# Altium footprint library WR-TBL_Rising Cage Clamp.PcbLib: 435 footprints (part 4 of 28)
Each footprint in its own frame and in the unit in brackets; x right, y up, seen from the top. Pads: shape width x height; smd on the part's side, far side on the other; paste and mask are expansions set on the pad; w line width, h text height; cw(c..) or ccw(c..) is an arc to the next point about the centre after c.
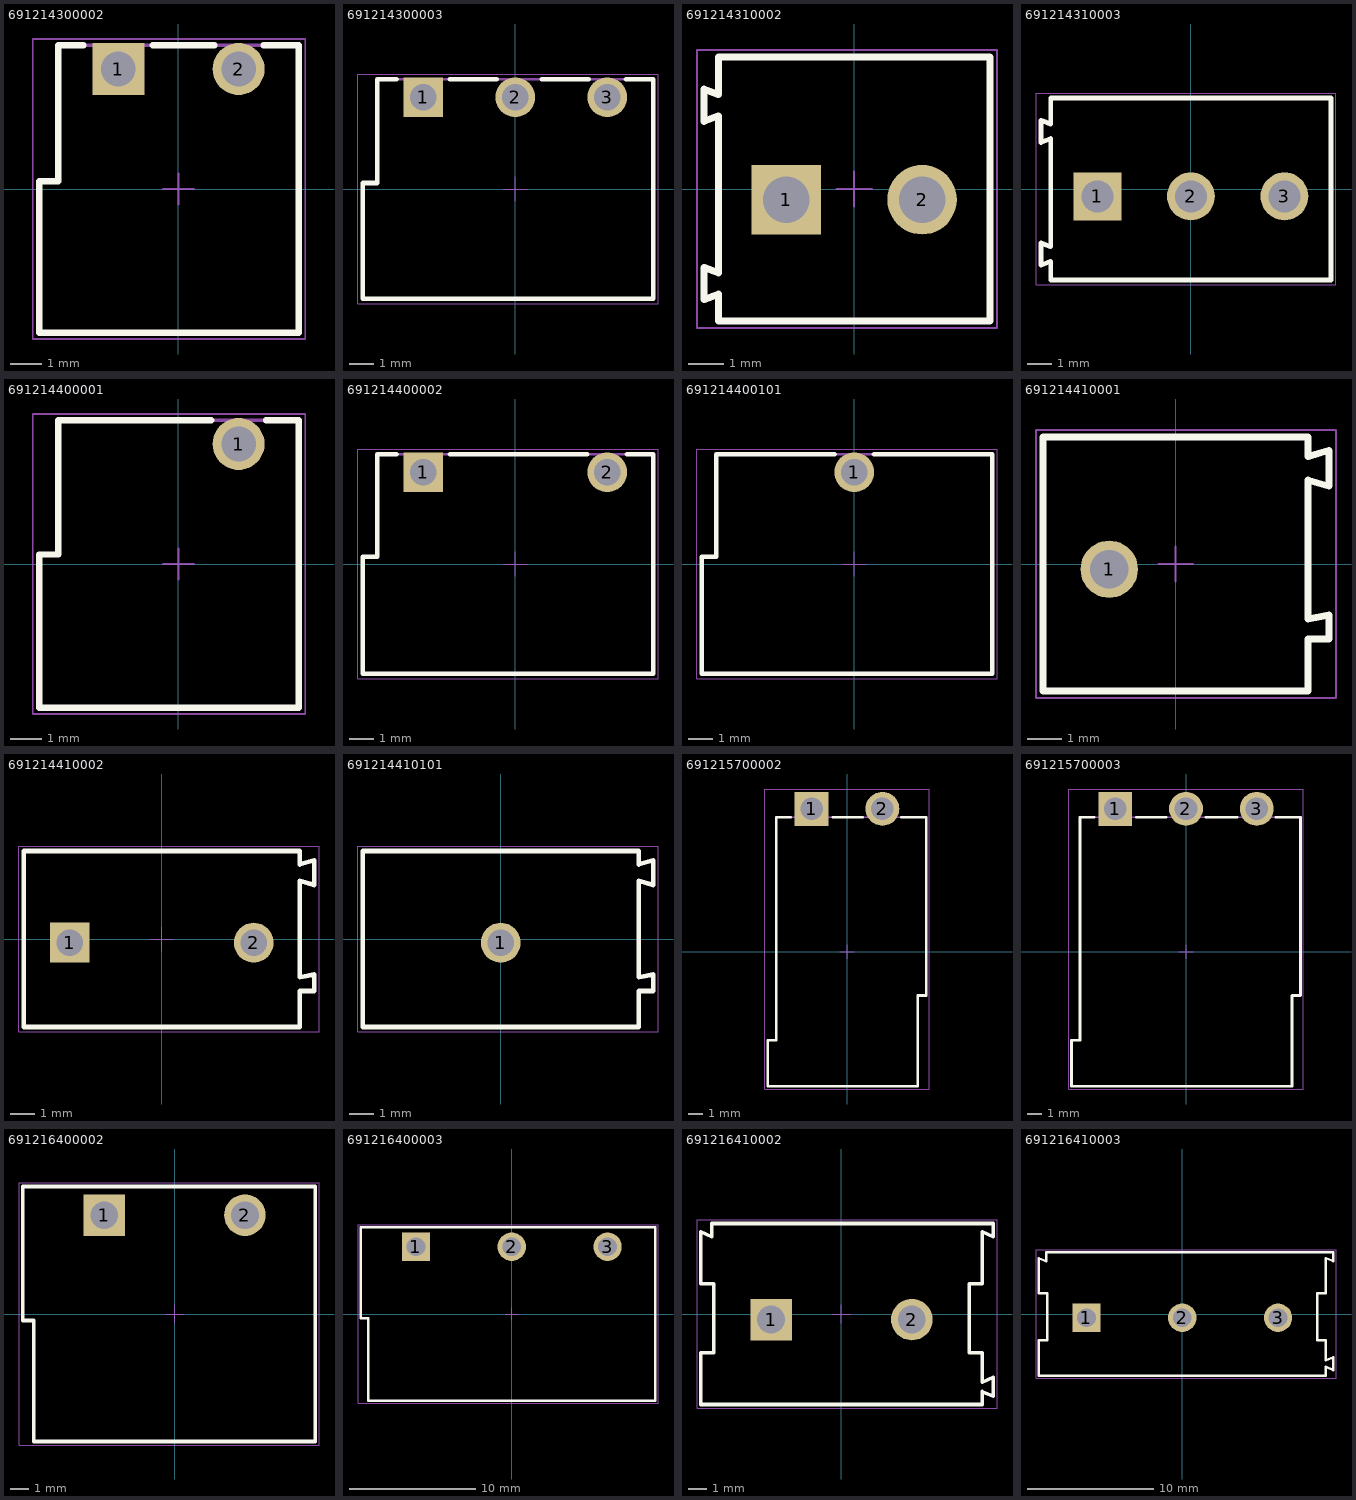
[diagram p3: the footprints below, top view; thin cyan lines are the x and y axes]

## 691214300002 [mm] "Serie 2143 - 3.81 mm _ 2 pins"
height 7.3
pads (2):
  rect 1.65x1.65 hole 1.1: 1(-1.905,3.8)
  round 1.65 hole 1.1: 2(1.905,3.8)
Top Overlay:
  lines w0.2: -3.01,4.55 -3.81,4.55 -3.81,0.25 -4.41,0.25 -4.41,-4.55 3.81,-4.55 3.81,4.55 2.69,4.55 ; -0.81,4.55 1.14,4.55
Mechanical 13:
  lines w0.1: -4.41,-4.55 3.81,-4.55 3.81,4.55 -3.81,4.55 -3.81,0.25 -4.41,0.25 -4.41,-4.55
Mechanical 15:
  lines w0.05: -0.5,0 0.5,0 ; 0,-0.5 0,0.5 ; -4.61,-4.75 4.01,-4.75 4.01,4.75 -4.61,4.75 -4.61,-4.75
3D body "691214300002.stp": height 7.35, standoff -3.45, extent -4.41,-4.55 3.81,4.55

## 691214300003 [mm] "Serie 2143 - 3.81 mm _ 3 pins"
height 7.3
pads (3):
  rect 1.65x1.65 hole 1.1: 1(-3.81,3.8)
  round 1.65 hole 1.1: 2(0,3.8) 3(3.81,3.8)
Top Overlay:
  lines w0.2: -4.915,4.55 -5.715,4.55 -5.715,0.25 -6.315,0.25 -6.315,-4.55 5.715,-4.55 5.715,4.55 4.595,4.55 ; -2.715,4.55 -0.765,4.55 ; 1.095,4.55 3.045,4.55
Mechanical 13:
  lines w0.1: -6.315,-4.55 5.715,-4.55 5.715,4.55 -5.715,4.55 -5.715,0.25 -6.315,0.25 -6.315,-4.55
Mechanical 15:
  lines w0.05: -0.5,0 0.5,0 ; 0,-0.5 0,0.5 ; -6.515,-4.75 5.915,-4.75 5.915,4.75 -6.515,4.75 -6.515,-4.75
3D body "691214300003.stp": height 7.35, standoff -3.45, extent -6.315,-4.55 5.715,4.55

## 691214310002 [mm] "3,81mm - Horizontal wire entry - Rising cage clamp - 02p"
height 8.5
pads (2):
  rect 1.95x1.95 hole 1.3: 1(-1.905,-0.3)
  round 1.95 hole 1.3: 2(1.905,-0.3)
Top Overlay:
  lines w0.2: -4.205,-3.1 -3.805,-2.95 -3.805,-3.7 3.805,-3.7 3.805,3.7 -3.805,3.7 -3.805,2.65 -4.205,2.8 -4.205,1.9 -3.805,2.05 -3.805,-2.35 -4.205,-2.2 -4.205,-3.1
Mechanical 13:
  lines w0.1: -4.205,-3.1 -4.205,-2.2 -3.805,-2.35 -3.805,2.05 -4.205,1.9 -4.205,2.8 -3.805,2.65 -3.805,3.7 3.805,3.7 3.805,-3.7 -3.805,-3.7 -3.805,-2.95 -4.205,-3.1
Mechanical 15:
  lines w0.05: -0.5,0 0.5,0 ; 0,-0.5 0,0.5 ; -4.405,-3.9 -4.405,3.9 4.005,3.9 4.005,-3.9 -4.405,-3.9
3D body "691214310002.stp": height 8.55, standoff -3.75, extent -4.215,-3.7 3.805,3.7

## 691214310003 [mm] "3,81mm - Horizontal wire entry - Rising cage clamp - 03p"
height 8.5
pads (3):
  rect 1.95x1.95 hole 1.3: 1(-3.81,-0.3)
  round 1.95 hole 1.3: 2(0,-0.3) 3(3.81,-0.3)
Top Overlay:
  lines w0.2: -6.11,-3.1 -5.71,-2.95 -5.71,-3.7 5.71,-3.7 5.71,3.7 -5.71,3.7 -5.71,2.65 -6.11,2.8 -6.11,1.9 -5.71,2.05 -5.71,-2.35 -6.11,-2.2 -6.11,-3.1
Mechanical 13:
  lines w0.1: -6.11,-3.1 -6.11,-2.2 -5.71,-2.35 -5.71,2.05 -6.11,1.9 -6.11,2.8 -5.71,2.65 -5.71,3.7 5.71,3.7 5.71,-3.7 -5.71,-3.7 -5.71,-2.95 -6.11,-3.1
Mechanical 15:
  lines w0.05: -0.5,0 0.5,0 ; 0,-0.5 0,0.5 ; -6.31,-3.9 -6.31,3.9 5.91,3.9 5.91,-3.9 -6.31,-3.9
3D body "691214310003.stp": height 8.55, standoff -3.75, extent -6.12,-3.7 5.71,3.7

## 691214400001 [mm] "7.62 mm Vertical Cable Entry with Rising Cage Clamp, 1 pin"
height 7.3
pads (1):
  round 1.65 hole 1.1: 1(1.905,3.8)
Top Overlay:
  lines w0.2: 1.04,4.55 -3.81,4.55 -3.81,0.3 -4.41,0.3 -4.41,-4.55 3.81,-4.55 3.81,4.55 2.77,4.55
Mechanical 13:
  lines w0.1: -4.41,-4.55 3.81,-4.55 3.81,4.55 -3.81,4.55 -3.81,0.3 -4.41,0.3 -4.41,-4.55
Mechanical 15:
  lines w0.05: -0.5,0 0.5,0 ; 0,-0.5 0,0.5 ; -4.61,-4.75 4.01,-4.75 4.01,4.75 -4.61,4.75 -4.61,-4.75
3D body "691214400001.stp": height 7.4, standoff -3.4, extent -4.41,-4.55 3.81,4.55

## 691214400002 [mm] "7.62 mm Vertical Cable Entry with Rising Cage Clamp, 2 pins"
height 7.3
pads (2):
  rect 1.65x1.65 hole 1.1: 1(-3.81,3.8)
  round 1.65 hole 1.1: 2(3.81,3.8)
Top Overlay:
  lines w0.2: -4.915,4.55 -5.715,4.55 -5.715,0.3 -6.315,0.3 -6.315,-4.55 5.715,-4.55 5.715,4.55 4.635,4.55 ; -2.705,4.55 2.985,4.55
Mechanical 13:
  lines w0.1: -6.315,-4.55 -6.315,0.3 -5.715,0.3 -5.715,4.55 5.715,4.55 5.715,-4.55 -6.315,-4.55
Mechanical 15:
  lines w0.05: -0.5,0 0.5,0 ; 0,-0.5 0,0.5 ; -6.515,-4.75 -6.515,4.75 5.915,4.75 5.915,-4.75 -6.515,-4.75
3D body "691214400002.stp": height 7.4, standoff -3.4, extent -6.315,-4.55 5.715,4.55

## 691214400101 [mm] "7.62 mm Vertical Cable Entry with Rising Cage Clamp, 1 pin"
height 7.3
pads (1):
  round 1.65 hole 1.1: 1(0,3.8)
Top Overlay:
  lines w0.2: -0.815,4.55 -5.715,4.55 -5.715,0.3 -6.315,0.3 -6.315,-4.55 5.715,-4.55 5.715,4.55 0.815,4.55
Mechanical 13:
  lines w0.1: -6.315,-4.55 5.715,-4.55 5.715,4.55 -5.715,4.55 -5.715,0.3 -6.315,0.3 -6.315,-4.55
Mechanical 15:
  lines w0.05: -0.5,0 0.5,0 ; 0,-0.5 0,0.5 ; -6.515,-4.75 5.915,-4.75 5.915,4.75 -6.515,4.75 -6.515,-4.75
3D body "691214400101.stp": height 7.4, standoff -3.4, extent -6.315,-4.55 5.715,4.55

## 691214410001 [mm] "7.62 mm Horizontal Entry w. Rising Cage Clamp, 01p"
height 9.1
pads (1):
  round 1.65 hole 1.1: 1(-1.905,-0.15)
Top Overlay:
  lines w0.2: -3.81,-3.65 -3.81,3.65 3.81,3.65 3.81,3.09 4.41,3.265 4.41,2.235 3.81,2.41 3.81,-1.58 4.41,-1.47 4.41,-2.15 3.81,-2.15 3.81,-3.65 -3.81,-3.65
Mechanical 13:
  lines w0.1: -3.81,-3.65 3.81,-3.65 3.81,-2.15 4.41,-2.15 4.41,-1.47 3.81,-1.58 3.81,2.41 4.41,2.235 4.41,3.265 3.81,3.09 3.81,3.65 -3.81,3.65 -3.81,-3.65
Mechanical 15:
  lines w0.05: -0.5,0 0.5,0 ; 0,-0.5 0,0.5 ; -4.01,-3.85 -4.01,3.85 4.61,3.85 4.61,-3.85 -4.01,-3.85
3D body "691214410001.stp": height 9.2, standoff -3.4, extent -3.81,-3.65 4.41,3.65

## 691214410002 [mm] "7.62 mm Horizontal Entry w. Rising Cage Clamp, 02p"
height 9.1
pads (2):
  rect 1.65x1.65 hole 1.1: 1(-3.81,-0.15)
  round 1.65 hole 1.1: 2(3.81,-0.15)
Top Overlay:
  lines w0.2: -5.715,-3.65 5.715,-3.65 5.715,-2.15 6.315,-2.15 6.315,-1.47 5.715,-1.58 5.715,2.41 6.315,2.235 6.315,3.265 5.715,3.09 5.715,3.65 -5.715,3.65 -5.715,-3.65
Mechanical 13:
  lines w0.1: -5.715,-3.65 -5.715,3.65 5.715,3.65 5.715,3.09 6.315,3.265 6.315,2.235 5.715,2.41 5.715,-1.58 6.315,-1.47 6.315,-2.15 5.715,-2.15 5.715,-3.65 -5.715,-3.65
Mechanical 15:
  lines w0.05: -0.5,0 0.5,0 ; 0,-0.5 0,0.5 ; -5.915,-3.85 6.515,-3.85 6.515,3.85 -5.915,3.85 -5.915,-3.85
3D body "691214410002.stp": height 9.2, standoff -3.4, extent -5.715,-3.65 6.315,3.65

## 691214410101 [mm] "7.62 mm Horizontal Entry w. Rising Cage Clamp, 01p"
height 9.1
pads (1):
  round 1.65 hole 1.1: 1(0,-0.15)
Top Overlay:
  lines w0.2: -5.715,-3.65 5.715,-3.65 5.715,-2.15 6.315,-2.15 6.315,-1.47 5.715,-1.58 5.715,2.41 6.315,2.235 6.315,3.265 5.715,3.09 5.715,3.65 -5.715,3.65 -5.715,-3.65
Mechanical 13:
  lines w0.1: -5.715,-3.65 -5.715,3.65 5.715,3.65 5.715,3.09 6.315,3.265 6.315,2.235 5.715,2.41 5.715,-1.58 6.315,-1.47 6.315,-2.15 5.715,-2.15 5.715,-3.65 -5.715,-3.65
Mechanical 15:
  lines w0.05: -0.5,0 0.5,0 ; 0,-0.5 0,0.5 ; -5.915,-3.85 6.515,-3.85 6.515,3.85 -5.915,3.85 -5.915,-3.85
3D body "691214410101.stp": height 9.2, standoff -3.4, extent -5.715,-3.65 6.315,3.65

## 691215700002 [mm]
height 10.5
pads (2):
  rect 2.4x2.4 hole 1.6: 1(-2.5,10.1)
  round 2.4 hole 1.6: 2(2.5,10.1)
Top Overlay:
  lines w0.2: -4,9.5 -5,9.5 -5,-6.25 -5.6,-6.25 -5.6,-9.5 5,-9.5 5,-3.1 5.6,-3.1 5.6,9.5 3.85,9.5 ; -1,9.5 1.1,9.5
Mechanical 13:
  lines w0.1: -5.6,-9.5 -5.6,-6.25 -5,-6.25 -5,9.5 5.6,9.5 5.6,-3.1 5,-3.1 5,-9.5 -5.6,-9.5
Mechanical 15:
  lines w0.05: -0.5,0 0.5,0 ; 0,-0.5 0,0.5 ; -5.8,-9.7 -5.8,11.5 5.8,11.5 5.8,-9.7 -5.8,-9.7
3D body "691215700002.stp": height 10.53, standoff -3.97, extent -5.6,-9.5 5.6,10.5

## 691215700003 [mm]
height 10.5
pads (3):
  rect 2.4x2.4 hole 1.6: 1(-5,10.1)
  round 2.4 hole 1.6: 2(0,10.1) 3(5,10.1)
Top Overlay:
  lines w0.2: -6.5,9.5 -7.5,9.5 -7.5,-6.25 -8.1,-6.25 -8.1,-9.5 7.5,-9.5 7.5,-3.1 8.1,-3.1 8.1,9.5 6.35,9.5 ; -3.5,9.5 -1.4,9.5 ; 1.4,9.5 3.6,9.5
Mechanical 13:
  lines w0.1: -8.1,-9.5 7.5,-9.5 7.5,-3.1 8.1,-3.1 8.1,9.5 -7.5,9.5 -7.5,-6.25 -8.1,-6.25 -8.1,-9.5
Mechanical 15:
  lines w0.05: -0.5,0 0.5,0 ; 0,-0.5 0,0.5 ; -8.3,-9.7 8.3,-9.7 8.3,11.5 -8.3,11.5 -8.3,-9.7
3D body "691215700003.stp": height 10.53, standoff -3.97, extent -8.1,-9.5 8.1,10.5

## 691216400002 [mm] "Vertical Cable Entry with Rising Cage Clamp, pitch 7.62mm, 02p"
height 9.8
pads (2):
  rect 2.25x2.25 hole 1.5: 1(-3.81,5.35)
  round 2.25 hole 1.5: 2(3.81,5.35)
Top Overlay:
  lines w0.2: -8.22,-0.35 -7.62,-0.35 -7.62,-6.9 7.62,-6.9 7.62,6.9 -8.22,6.9 -8.22,-0.35
Mechanical 13:
  lines w0.1: -8.22,-0.35 -8.22,6.9 7.62,6.9 7.62,-6.9 -7.62,-6.9 -7.62,-0.35 -8.22,-0.35
Mechanical 15:
  lines w0.05: -0.5,0 0.5,0 ; 0,-0.5 0,0.5 ; -8.42,-7.1 -8.42,7.1 7.82,7.1 7.82,-7.1 -8.42,-7.1
3D body "691216400002.stp": height 9.9, standoff -3.4, extent -8.22,-6.9 7.62,6.9

## 691216400003 [mm] "Vertical Cable Entry with Rising Cage Clamp, pitch 7.62mm, 03p"
height 9.8
pads (3):
  rect 2.25x2.25 hole 1.5: 1(-7.62,5.35)
  round 2.25 hole 1.5: 2(0,5.35) 3(7.62,5.35)
Top Overlay:
  lines w0.2: -12.03,-0.35 -12.03,6.9 11.43,6.9 11.43,-6.9 -11.43,-6.9 -11.43,-0.35 -12.03,-0.35
Mechanical 13:
  lines w0.1: -12.03,-0.35 -11.43,-0.35 -11.43,-6.9 11.43,-6.9 11.43,6.9 -12.03,6.9 -12.03,-0.35
Mechanical 15:
  lines w0.05: -0.5,0 0.5,0 ; 0,-0.5 0,0.5 ; -12.23,-7.1 11.63,-7.1 11.63,7.1 -12.23,7.1 -12.23,-7.1
3D body "691216400003.stp": height 9.9, standoff -3.4, extent -12.03,-6.9 11.43,6.9

## 691216410002 [mm] "Horizontal Cable Entry with Rising Cage Clamp, pitch 7.62mm, 02p"
height 13.8
pads (2):
  rect 2.25x2.25 hole 1.5: 1(-3.81,-0.3)
  round 2.25 hole 1.5: 2(3.81,-0.3)
Top Overlay:
  lines w0.2: -7.62,4.45 -7.62,1.64 -6.92,1.64 -6.92,-2.09 -7.62,-2.09 -7.62,-4.9 7.62,-4.9 7.62,-4.2 ; -7.619,4.452 -7.02,4.19 -7.02,4.9 8.22,4.9 8.22,4.19 7.62,4.451 ; 7.62,-3.691 7.62,-2.09 6.92,-2.09 6.92,1.64 7.62,1.64 7.62,4.45 ; 7.621,-4.198 8.22,-4.46 8.22,-3.43 7.621,-3.692
Mechanical 13:
  lines w0.1: -7.62,4.45 -7.62,1.64 -6.92,1.64 -6.92,-2.09 -7.62,-2.09 -7.62,-4.9 7.62,-4.9 7.62,-4.2 ; -7.619,4.452 -7.02,4.19 -7.02,4.9 8.22,4.9 8.22,4.19 7.62,4.451 ; 7.62,-3.691 7.62,-2.09 6.92,-2.09 6.92,1.64 7.62,1.64 7.62,4.45 ; 7.621,-4.198 8.22,-4.46 8.22,-3.43 7.621,-3.692
Mechanical 15:
  lines w0.05: -0.5,0 0.5,0 ; 0,-0.5 0,0.5 ; -7.82,-5.1 -7.82,5.1 8.42,5.1 8.42,-5.1 -7.82,-5.1
3D body "691216410002.stp": height 13.9, standoff -3.4, extent -7.62,-4.9 8.22,4.9

## 691216410003 [mm] "Horizontal Cable Entry with Rising Cage Clamp, pitch 7.62mm, 03p"
height 13.8
pads (3):
  rect 2.25x2.25 hole 1.5: 1(-7.62,-0.3)
  round 2.25 hole 1.5: 2(0,-0.3) 3(7.62,-0.3)
Top Overlay:
  lines w0.2: -11.43,4.45 -11.43,1.64 -10.73,1.64 -10.73,-2.09 -11.43,-2.09 -11.43,-4.9 11.43,-4.9 11.43,-4.2 ; -11.429,4.452 -10.83,4.19 -10.83,4.9 12.03,4.9 12.03,4.19 11.43,4.451 ; 11.43,-3.691 11.43,-2.09 10.73,-2.09 10.73,1.64 11.43,1.64 11.43,4.45 ; 11.431,-4.198 12.03,-4.46 12.03,-3.43 11.431,-3.692
Mechanical 13:
  lines w0.1: -11.43,4.45 -11.43,1.64 -10.73,1.64 -10.73,-2.09 -11.43,-2.09 -11.43,-4.9 11.43,-4.9 11.43,-4.2 ; -11.429,4.452 -10.83,4.19 -10.83,4.9 12.03,4.9 12.03,4.19 11.43,4.451 ; 11.43,-3.691 11.43,-2.09 10.73,-2.09 10.73,1.64 11.43,1.64 11.43,4.45 ; 11.431,-4.198 12.03,-4.46 12.03,-3.43 11.431,-3.692
Mechanical 15:
  lines w0.05: -0.5,0 0.5,0 ; 0,-0.5 0,0.5 ; -11.63,-5.1 12.23,-5.1 12.23,5.1 -11.63,5.1 -11.63,-5.1
3D body "691216410003.stp": height 13.9, standoff -3.4, extent -11.43,-4.9 12.03,4.9